# Altium footprint library WR-TBL_Pluggable PCB Header_3.81mm.PcbLib: 200 footprints (part 13 of 13)
Each footprint in its own frame and in the unit in brackets; x right, y up, seen from the top. Pads: shape width x height; smd on the part's side, far side on the other; paste and mask are expansions set on the pad; w line width, h text height; cw(c..) or ccw(c..) is an arc to the next point about the centre after c.
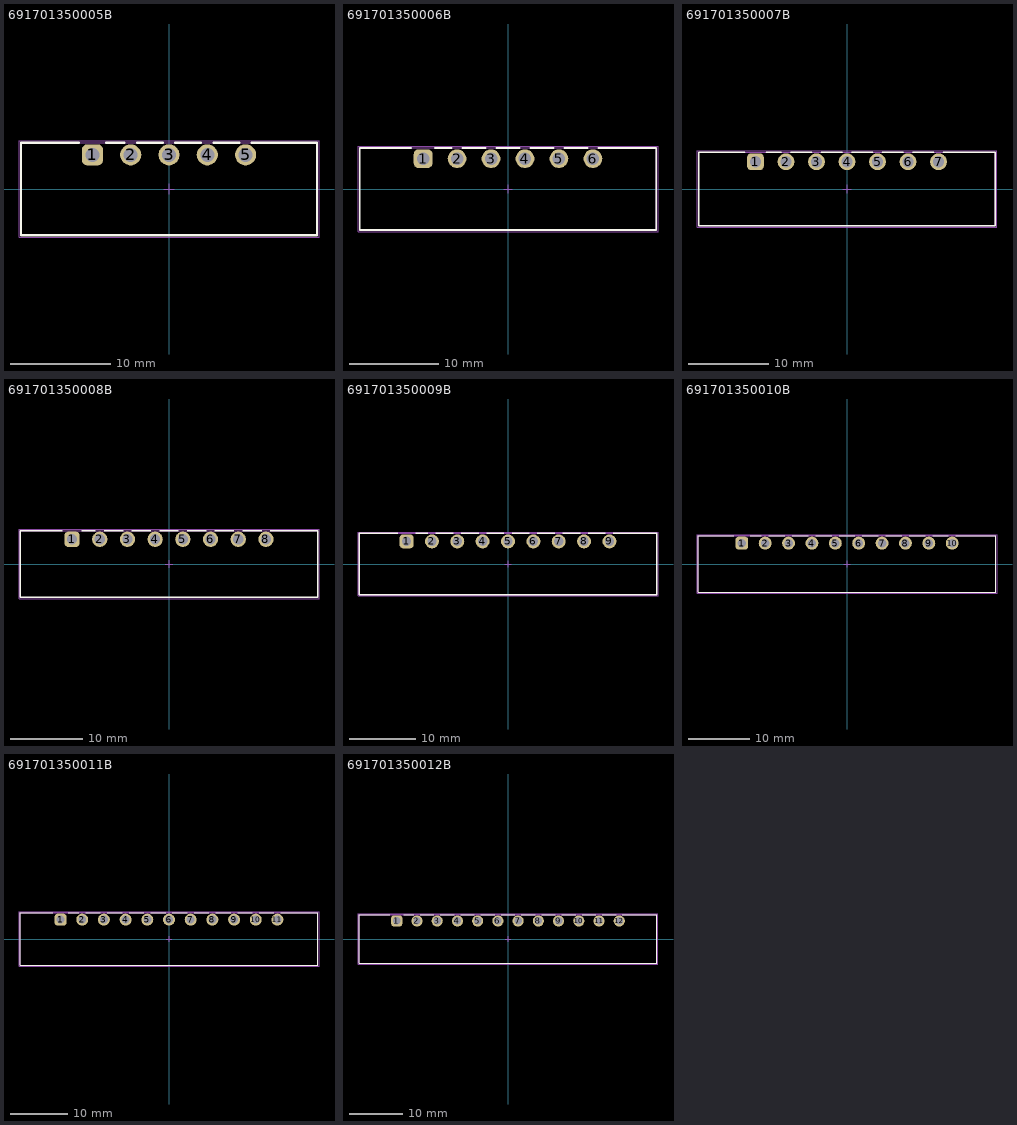
[diagram p12: the footprints below, top view; thin cyan lines are the x and y axes]

## 691701350005B [mm] "Horizontal PCB Header THR Type with Flanges, pitch 3.81mm, 05p"
height 7.3
pads (5):
  rrect50% 2.1x2.1 hole 1.4: 1(-7.62,3.4)
  round 2.1 hole 1.4: 2(-3.81,3.4) 3(0,3.4) 4(3.81,3.4) 5(7.62,3.4)
Top Overlay:
  lines w0.2: -8.97,4.6 -14.72,4.6 -14.72,-4.6 14.72,-4.6 14.72,4.6 8.23,4.6 ; -6.27,4.6 -4.42,4.6 ; -3.2,4.6 -0.61,4.6 ; 0.61,4.6 3.2,4.6 ; 4.42,4.6 7.01,4.6
Top Designator:
  text ".Designator" at -7.498,-0.5 h1.5
Top Component Outline:
  lines w0.1: -14.72,-4.6 -14.72,4.6 14.72,4.6 14.72,-4.6 -14.72,-4.6
Top 3D Body:
  lines w0.1: -14.72,-4.6 14.72,-4.6 14.72,4.6 -14.72,4.6 -14.72,-4.6
Top Courtyard:
  lines w0.05: -14.92,-4.8 -14.92,4.8 14.92,4.8 14.92,-4.8 -14.92,-4.8
Top Component Center:
  lines w0.05: -0.5,0 0.5,0 ; 0,-0.5 0,0.5
3D body "691701350005B.stp": height 7.35, standoff -2.55, extent -14.72,-4.6 14.72,4.6

## 691701350006B [mm] "Horizontal PCB Header THR Type with Flanges, pitch 3.81mm, 06p"
height 7.3
pads (6):
  rrect50% 2.1x2.1 hole 1.4: 1(-9.525,3.4)
  round 2.1 hole 1.4: 2(-5.715,3.4) 3(-1.905,3.4) 4(1.905,3.4) 5(5.715,3.4) 6(9.525,3.4)
Top Overlay:
  lines w0.2: -10.875,4.6 -16.625,4.6 -16.625,-4.6 16.625,-4.6 16.625,4.6 10.135,4.6 ; -8.175,4.6 -6.325,4.6 ; -5.105,4.6 -2.515,4.6 ; -1.295,4.6 1.295,4.6 ; 2.515,4.6 5.105,4.6 ; 6.325,4.6 8.915,4.6
Top Designator:
  text ".Designator" at -7.498,-0.5 h1.5
Top Component Outline:
  lines w0.1: -16.625,-4.6 16.625,-4.6 16.625,4.6 -16.625,4.6 -16.625,-4.6
Top 3D Body:
  lines w0.1: -16.625,-4.6 -16.625,4.6 16.625,4.6 16.625,-4.6 -16.625,-4.6
Top Courtyard:
  lines w0.05: -16.825,-4.8 16.825,-4.8 16.825,4.8 -16.825,4.8 -16.825,-4.8
Top Component Center:
  lines w0.05: -0.5,0 0.5,0 ; 0,-0.5 0,0.5
3D body "691701350006B.stp": height 7.35, standoff -2.55, extent -16.625,-4.6 16.625,4.6

## 691701350007B [mm] "Horizontal PCB Header THR Type with Flanges, pitch 3.81mm, 07p"
height 7.3
pads (7):
  rrect50% 2.1x2.1 hole 1.4: 1(-11.43,3.4)
  round 2.1 hole 1.4: 2(-7.62,3.4) 3(-3.81,3.4) 4(0,3.4) 5(3.81,3.4) 6(7.62,3.4) 7(11.43,3.4)
Top Overlay:
  lines w0.2: -12.78,4.6 -18.53,4.6 -18.53,-4.6 18.53,-4.6 18.53,4.6 12.04,4.6 ; -10.08,4.6 -8.23,4.6 ; -7.01,4.6 -4.42,4.6 ; -3.2,4.6 -0.61,4.6 ; 0.61,4.6 3.2,4.6 ; 4.42,4.6 7.01,4.6 ; 8.23,4.6 10.82,4.6
Top Designator:
  text ".Designator" at -7.498,-0.5 h1.5
Top Component Outline:
  lines w0.1: -18.53,-4.6 -18.53,4.6 18.53,4.6 18.53,-4.6 -18.53,-4.6
Top 3D Body:
  lines w0.1: -18.53,-4.6 18.53,-4.6 18.53,4.6 -18.53,4.6 -18.53,-4.6
Top Courtyard:
  lines w0.05: -18.73,-4.8 -18.73,4.8 18.73,4.8 18.73,-4.8 -18.73,-4.8
Top Component Center:
  lines w0.05: -0.5,0 0.5,0 ; 0,-0.5 0,0.5
3D body "691701350007B.stp": height 7.35, standoff -2.55, extent -18.53,-4.6 18.53,4.6

## 691701350008B [mm] "Horizontal PCB Header THR Type with Flanges, pitch 3.81mm, 08p"
height 7.3
pads (8):
  rrect50% 2.1x2.1 hole 1.4: 1(-13.335,3.4)
  round 2.1 hole 1.4: 2(-9.525,3.4) 3(-5.715,3.4) 4(-1.905,3.4) 5(1.905,3.4) 6(5.715,3.4) 7(9.525,3.4) 8(13.335,3.4)
Top Overlay:
  lines w0.2: -14.685,4.6 -20.435,4.6 -20.435,-4.6 20.435,-4.6 20.435,4.6 13.945,4.6 ; -11.985,4.6 -10.135,4.6 ; -8.915,4.6 -6.325,4.6 ; -5.105,4.6 -2.515,4.6 ; -1.295,4.6 1.295,4.6 ; 2.515,4.6 5.105,4.6 ; 6.325,4.6 8.915,4.6 ; 10.135,4.6 12.725,4.6
Top Designator:
  text ".Designator" at -7.498,-0.5 h1.5
Top Component Outline:
  lines w0.1: -20.435,-4.6 -20.435,4.6 20.435,4.6 20.435,-4.6 -20.435,-4.6
Top 3D Body:
  lines w0.1: -20.435,-4.6 20.435,-4.6 20.435,4.6 -20.435,4.6 -20.435,-4.6
Top Courtyard:
  lines w0.05: -20.635,-4.8 -20.635,4.8 20.635,4.8 20.635,-4.8 -20.635,-4.8
Top Component Center:
  lines w0.05: -0.5,0 0.5,0 ; 0,-0.5 0,0.5
3D body "691701350008B.stp": height 7.35, standoff -2.55, extent -20.435,-4.6 20.435,4.6

## 691701350009B [mm] "Horizontal PCB Header THR Type with Flanges, pitch 3.81mm, 09p"
height 7.3
pads (9):
  rrect50% 2.1x2.1 hole 1.4: 1(-15.24,3.4)
  round 2.1 hole 1.4: 2(-11.43,3.4) 3(-7.62,3.4) 4(-3.81,3.4) 5(0,3.4) 6(3.81,3.4) 7(7.62,3.4) 8(11.43,3.4) 9(15.24,3.4)
Top Overlay:
  lines w0.2: -16.59,4.6 -22.34,4.6 -22.34,-4.6 22.34,-4.6 22.34,4.6 15.85,4.6 ; -13.89,4.6 -12.04,4.6 ; -10.82,4.6 -8.23,4.6 ; -7.01,4.6 -4.42,4.6 ; -3.2,4.6 -0.61,4.6 ; 0.61,4.6 3.2,4.6 ; 4.42,4.6 7.01,4.6 ; 8.23,4.6 10.82,4.6 ; 12.04,4.6 14.63,4.6
Top Designator:
  text ".Designator" at -7.498,-0.5 h1.5
Top Component Outline:
  lines w0.1: -22.34,-4.6 22.34,-4.6 22.34,4.6 -22.34,4.6 -22.34,-4.6
Top 3D Body:
  lines w0.1: -22.34,-4.6 -22.34,4.6 22.34,4.6 22.34,-4.6 -22.34,-4.6
Top Courtyard:
  lines w0.05: -22.54,-4.8 22.54,-4.8 22.54,4.8 -22.54,4.8 -22.54,-4.8
Top Component Center:
  lines w0.05: -0.5,0 0.5,0 ; 0,-0.5 0,0.5
3D body "691701350009B.stp": height 7.35, standoff -2.55, extent -22.34,-4.6 22.34,4.6

## 691701350010B [mm] "Horizontal PCB Header THR Type with Flanges, pitch 3.81mm, 10p"
height 7.3
pads (10):
  rrect50% 2.1x2.1 hole 1.4: 1(-17.145,3.4)
  round 2.1 hole 1.4: 2(-13.335,3.4) 3(-9.525,3.4) 4(-5.715,3.4) 5(-1.905,3.4) 6(1.905,3.4) 7(5.715,3.4) 8(9.525,3.4) 9(13.335,3.4) 10(17.145,3.4)
Top Overlay:
  lines w0.2: -18.495,4.6 -24.245,4.6 -24.245,-4.6 24.245,-4.6 24.245,4.6 17.755,4.6 ; -15.795,4.6 -13.945,4.6 ; -12.725,4.6 -10.135,4.6 ; -8.915,4.6 -6.325,4.6 ; -5.105,4.6 -2.515,4.6 ; -1.295,4.6 1.295,4.6 ; 2.515,4.6 5.105,4.6 ; 6.325,4.6 8.915,4.6 ; 10.135,4.6 12.725,4.6 ; 13.945,4.6 16.535,4.6
Top Designator:
  text ".Designator" at -7.498,-0.5 h1.5
Top Component Outline:
  lines w0.1: -24.245,-4.6 24.245,-4.6 24.245,4.6 -24.245,4.6 -24.245,-4.6
Top 3D Body:
  lines w0.1: -24.245,-4.6 -24.245,4.6 24.245,4.6 24.245,-4.6 -24.245,-4.6
Top Courtyard:
  lines w0.05: -24.445,-4.8 24.445,-4.8 24.445,4.8 -24.445,4.8 -24.445,-4.8
Top Component Center:
  lines w0.05: -0.5,0 0.5,0 ; 0,-0.5 0,0.5
3D body "691701350010B.stp": height 7.35, standoff -2.55, extent -24.245,-4.6 24.245,4.6

## 691701350011B [mm] "Horizontal PCB Header THR Type with Flanges, pitch 3.81mm, 11p"
height 7.3
pads (11):
  rrect50% 2.1x2.1 hole 1.4: 1(-19.05,3.4)
  round 2.1 hole 1.4: 2(-15.24,3.4) 3(-11.43,3.4) 4(-7.62,3.4) 5(-3.81,3.4) 6(0,3.4) 7(3.81,3.4) 8(7.62,3.4) 9(11.43,3.4) 10(15.24,3.4) 11(19.05,3.4)
Top Overlay:
  lines w0.2: -20.4,4.6 -26.15,4.6 -26.15,-4.6 26.15,-4.6 26.15,4.6 19.66,4.6 ; -17.7,4.6 -15.85,4.6 ; -14.63,4.6 -12.04,4.6 ; -10.82,4.6 -8.23,4.6 ; -7.01,4.6 -4.42,4.6 ; -3.2,4.6 -0.61,4.6 ; 0.61,4.6 3.2,4.6 ; 4.42,4.6 7.01,4.6 ; 8.23,4.6 10.82,4.6 ; 12.04,4.6 14.63,4.6 ; 15.85,4.6 18.44,4.6
Top Designator:
  text ".Designator" at -7.498,-0.5 h1.5
Top Component Outline:
  lines w0.1: -26.15,-4.6 -26.15,4.6 26.15,4.6 26.15,-4.6 -26.15,-4.6
Top 3D Body:
  lines w0.1: -26.15,-4.6 26.15,-4.6 26.15,4.6 -26.15,4.6 -26.15,-4.6
Top Courtyard:
  lines w0.05: -26.35,-4.8 -26.35,4.8 26.35,4.8 26.35,-4.8 -26.35,-4.8
Top Component Center:
  lines w0.05: -0.5,0 0.5,0 ; 0,-0.5 0,0.5
3D body "691701350011B.stp": height 7.35, standoff -2.55, extent -26.15,-4.6 26.15,4.6

## 691701350012B [mm] "Horizontal PCB Header THR Type with Flanges, pitch 3.81mm, 12p"
height 7.3
pads (12):
  rrect50% 2.1x2.1 hole 1.4: 1(-20.955,3.4)
  round 2.1 hole 1.4: 2(-17.145,3.4) 3(-13.335,3.4) 4(-9.525,3.4) 5(-5.715,3.4) 6(-1.905,3.4) 7(1.905,3.4) 8(5.715,3.4) 9(9.525,3.4) 10(13.335,3.4) 11(17.145,3.4) 12(20.955,3.4)
Top Overlay:
  lines w0.2: -22.305,4.6 -28.055,4.6 -28.055,-4.6 28.055,-4.6 28.055,4.6 21.565,4.6 ; -19.605,4.6 -17.755,4.6 ; -16.535,4.6 -13.945,4.6 ; -12.725,4.6 -10.135,4.6 ; -8.915,4.6 -6.325,4.6 ; -5.105,4.6 -2.515,4.6 ; -1.295,4.6 1.295,4.6 ; 2.515,4.6 5.105,4.6 ; 6.325,4.6 8.915,4.6 ; 10.135,4.6 12.725,4.6 ; 13.945,4.6 16.535,4.6 ; 17.755,4.6 20.345,4.6
Top Designator:
  text ".Designator" at -7.498,-0.5 h1.5
Top Component Outline:
  lines w0.1: -28.055,-4.6 28.055,-4.6 28.055,4.6 -28.055,4.6 -28.055,-4.6
Top 3D Body:
  lines w0.1: -28.055,-4.6 -28.055,4.6 28.055,4.6 28.055,-4.6 -28.055,-4.6
Top Courtyard:
  lines w0.05: -28.255,-4.8 28.255,-4.8 28.255,4.8 -28.255,4.8 -28.255,-4.8
Top Component Center:
  lines w0.05: -0.5,0 0.5,0 ; 0,-0.5 0,0.5
3D body "691701350012B.stp": height 7.35, standoff -2.55, extent -28.055,-4.6 28.055,4.6